# Altium footprint library ref-packages.PCBLIB: 1544 footprints (part 31 of 103)
Each footprint in its own frame and in the unit in brackets; x right, y up, seen from the top. Pads: shape width x height; smd on the part's side, far side on the other; paste and mask are expansions set on the pad; w line width, h text height; cw(c..) or ccw(c..) is an arc to the next point about the centre after c.
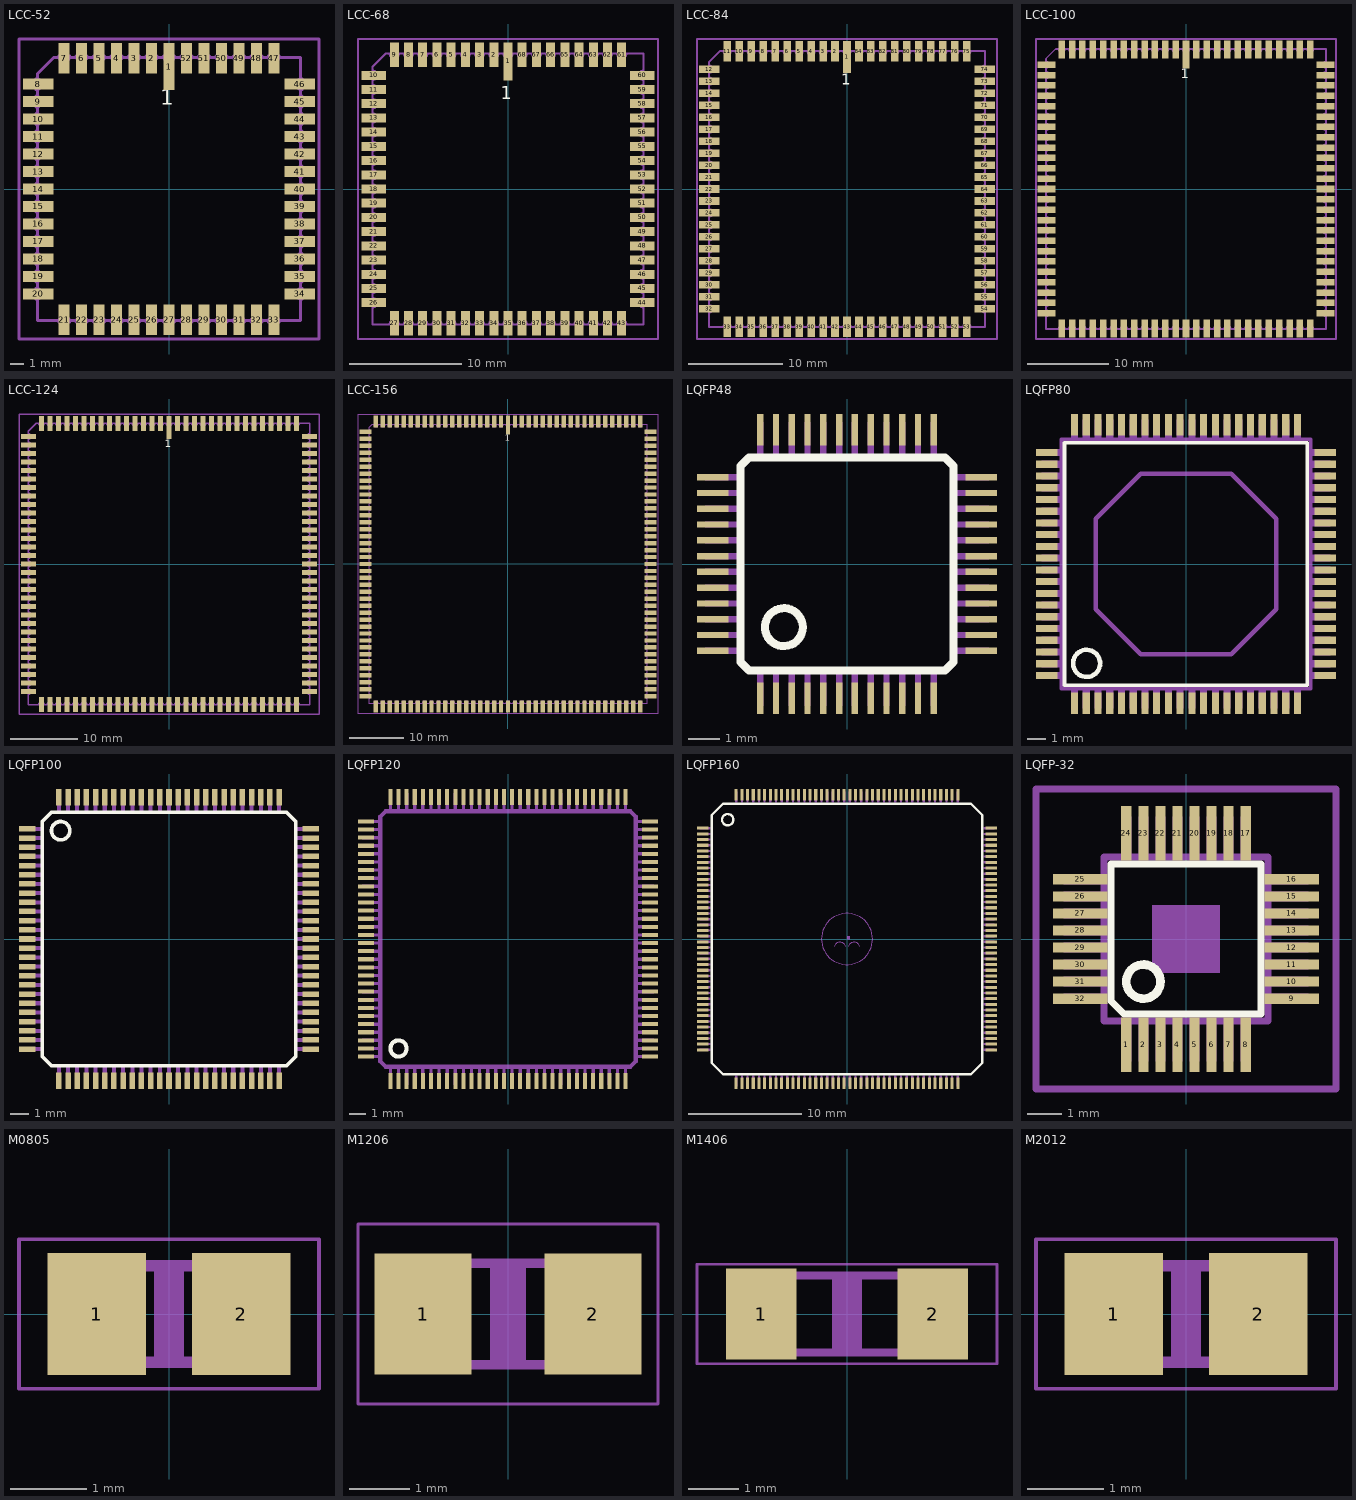
[diagram p30: the footprints below, top view; thin cyan lines are the x and y axes]

## LCC-52 [mil]
pads (52):
  rect 31.5x133.86 smd: 1(0,350.39)
  rect 31.5x86.61 smd: 2(-50,374.02) 3(-100,374.02) 4(-150,374.02) 5(-200,374.02) 6(-250,374.02) 7(-300,374.02) 21(-300,-374.02) 22(-250,-374.02) 23(-200,-374.02) 24(-150,-374.02) 25(-100,-374.02) 26(-50,-374.02) 27(0,-374.02) 28(50,-374.02) 29(100,-374.02) 30(150,-374.02) 31(200,-374.02) 32(250,-374.02) 33(300,-374.02) 47(300,374.02) 48(250,374.02) 49(200,374.02) 50(150,374.02) 51(100,374.02) 52(50,374.02)
  rect 86.61x31.5 smd: 8(-374.02,300) 9(-374.02,250) 10(-374.02,200) 11(-374.02,150) 12(-374.02,100) 13(-374.02,50) 14(-374.02,0) 15(-374.02,-50) 16(-374.02,-100) 17(-374.02,-150) 18(-374.02,-200) 19(-374.02,-250) 20(-374.02,-300) 34(374.02,-300) 35(374.02,-250) 36(374.02,-200) 37(374.02,-150) 38(374.02,-100) 39(374.02,-50) 40(374.02,0) 41(374.02,50) 42(374.02,100) 43(374.02,150) 44(374.02,200) 45(374.02,250) 46(374.02,300)
Top Overlay:
  text "1" at -25,225 h77.5
Mechanical 16:
  lines w8: -380.31,-315.75 ccw(c-380.31,-300) -380.31,-284.25 ; -380.31,-265.75 ccw(c-380.31,-250) -380.31,-234.25 ; -380.31,-215.75 ccw(c-380.31,-200) -380.31,-184.25 ; -380.31,-165.75 ccw(c-380.31,-150) -380.31,-134.25 ; -380.31,-115.75 ccw(c-380.31,-100) -380.31,-84.25 ; -380.31,-65.75 ccw(c-380.31,-50) -380.31,-34.25 ; -380.31,-15.75 ccw(c-380.31,0) -380.31,15.75 ; -380.31,34.25 ccw(c-380.31,50) -380.31,65.75 ; -380.31,84.25 ccw(c-380.31,100) -380.31,115.75 ; -380.31,134.25 ccw(c-380.31,150) -380.31,165.75 ; -380.31,184.25 ccw(c-380.31,200) -380.31,215.75 ; -380.31,234.25 ccw(c-380.31,250) -380.31,265.75 ; -380.31,284.25 ccw(c-380.31,300) -380.31,315.75 ; -376.38,-315.75 -376.38,-376.38 -315.75,-376.38 ; -376.38,-284.25 -376.38,-265.75 ; -376.38,-234.25 -376.38,-215.75 ; -376.38,-184.25 -376.38,-165.75 ; -376.38,-134.25 -376.38,-115.75 ; -376.38,-84.25 -376.38,-65.75 ; -376.38,-34.25 -376.38,-15.75 ; -376.38,15.75 -376.38,34.25 ; -376.38,65.75 -376.38,84.25 ; -376.38,115.75 -376.38,134.25 ; -376.38,165.75 -376.38,184.25 ; -376.38,215.75 -376.38,234.25 ; -376.38,265.75 -376.38,284.25 ; -376.38,315.75 -376.38,329.92 -329.92,376.38 -315.75,376.38 ; -315.75,-380.31 cw(c-300,-380.31) -284.25,-380.31 ; -315.75,380.31 ccw(c-300,380.31) -284.25,380.31 ; -284.25,-376.38 -265.75,-376.38 ; -284.25,376.38 -265.75,376.38 ; -265.75,-380.31 cw(c-250,-380.31) -234.25,-380.31 ; -265.75,380.31 ccw(c-250,380.31) -234.25,380.31 ; -234.25,-376.38 -215.75,-376.38 ; -234.25,376.38 -215.75,376.38 ; -215.75,-380.31 cw(c-200,-380.31) -184.25,-380.31 ; -215.75,380.31 ccw(c-200,380.31) -184.25,380.31 ; -184.25,-376.38 -165.75,-376.38 ; -184.25,376.38 -165.75,376.38 ; -165.75,-380.31 cw(c-150,-380.31) -134.25,-380.31 ; -165.75,380.31 ccw(c-150,380.31) -134.25,380.31 ; -134.25,-376.38 -115.75,-376.38 ; -134.25,376.38 -115.75,376.38 ; -115.75,-380.31 cw(c-100,-380.31) -84.25,-380.31 ; -115.75,380.31 ccw(c-100,380.31) -84.25,380.31 ; -84.25,-376.38 -65.75,-376.38 ; -84.25,376.38 -65.75,376.38 ; -65.75,-380.31 cw(c-50,-380.31) -34.25,-380.31 ; -65.75,380.31 ccw(c-50,380.31) -34.25,380.31 ; -34.25,-376.38 -15.75,-376.38 ; -34.25,376.38 -15.75,376.38 ; -15.75,-380.31 cw(c0,-380.31) 15.75,-380.31 ; -15.75,380.31 ccw(c0,380.31) 15.75,380.31 ; 15.75,-376.38 34.25,-376.38 ; 15.75,376.38 34.25,376.38 ; 34.25,-380.31 cw(c50,-380.31) 65.75,-380.31 ; 34.25,380.31 ccw(c50,380.31) 65.75,380.31 ; 65.75,-376.38 84.25,-376.38 ; 65.75,376.38 84.25,376.38 ; 84.25,-380.31 cw(c100,-380.31) 115.75,-380.31 ; 84.25,380.31 ccw(c100,380.31) 115.75,380.31 ; 115.75,-376.38 134.25,-376.38 ; 115.75,376.38 134.25,376.38 ; 134.25,-380.31 cw(c150,-380.31) 165.75,-380.31 ; 134.25,380.31 ccw(c150,380.31) 165.75,380.31 ; 165.75,-376.38 184.25,-376.38 ; 165.75,376.38 184.25,376.38 ; 184.25,-380.31 cw(c200,-380.31) 215.75,-380.31 ; 184.25,380.31 ccw(c200,380.31) 215.75,380.31 ; 215.75,-376.38 234.25,-376.38 ; 215.75,376.38 234.25,376.38 ; 234.25,-380.31 cw(c250,-380.31) 265.75,-380.31 ; 234.25,380.31 ccw(c250,380.31) 265.75,380.31 ; 265.75,-376.38 284.25,-376.38 ; 265.75,376.38 284.25,376.38 ; 284.25,-380.31 cw(c300,-380.31) 315.75,-380.31 ; 284.25,380.31 ccw(c300,380.31) 315.75,380.31 ; 315.75,-376.38 376.38,-376.38 376.38,-315.75 ; 315.75,376.38 376.38,376.38 376.38,315.75 ; 376.38,-284.25 376.38,-265.75 ; 376.38,-234.25 376.38,-215.75 ; 376.38,-184.25 376.38,-165.75 ; 376.38,-134.25 376.38,-115.75 ; 376.38,-84.25 376.38,-65.75 ; 376.38,-34.25 376.38,-15.75 ; 376.38,15.75 376.38,34.25 ; 376.38,65.75 376.38,84.25 ; 376.38,115.75 376.38,134.25 ; 376.38,165.75 376.38,184.25 ; 376.38,215.75 376.38,234.25 ; 376.38,265.75 376.38,284.25 ; 380.31,-315.75 cw(c380.31,-300) 380.31,-284.25 ; 380.31,-265.75 cw(c380.31,-250) 380.31,-234.25 ; 380.31,-215.75 cw(c380.31,-200) 380.31,-184.25 ; 380.31,-165.75 cw(c380.31,-150) 380.31,-134.25 ; 380.31,-115.75 cw(c380.31,-100) 380.31,-84.25 ; 380.31,-65.75 cw(c380.31,-50) 380.31,-34.25 ; 380.31,-15.75 cw(c380.31,0) 380.31,15.75 ; 380.31,34.25 cw(c380.31,50) 380.31,65.75 ; 380.31,84.25 cw(c380.31,100) 380.31,115.75 ; 380.31,134.25 cw(c380.31,150) 380.31,165.75 ; 380.31,184.25 cw(c380.31,200) 380.31,215.75 ; 380.31,234.25 cw(c380.31,250) 380.31,265.75 ; 380.31,284.25 cw(c380.31,300) 380.31,315.75
Mechanical 27:
  lines w7.87: -429.25,-429.25 429.25,-429.25 429.25,429.25 -429.25,429.25 -429.25,-429.25

## LCC-68 [mil]
pads (68):
  rect 31.5x133.86 smd: 1(0,448.82)
  rect 31.5x86.61 smd: 2(-50,472.44) 3(-100,472.44) 4(-150,472.44) 5(-200,472.44) 6(-250,472.44) 7(-300,472.44) 8(-350,472.44) 9(-400,472.44) 27(-400,-472.44) 28(-350,-472.44) 29(-300,-472.44) 30(-250,-472.44) 31(-200,-472.44) 32(-150,-472.44) 33(-100,-472.44) 34(-50,-472.44) 35(0,-472.44) 36(50,-472.44) 37(100,-472.44) 38(150,-472.44) 39(200,-472.44) 40(250,-472.44) 41(300,-472.44) 42(350,-472.44) 43(400,-472.44) 61(400,472.44) 62(350,472.44) 63(300,472.44) 64(250,472.44) 65(200,472.44) 66(150,472.44) 67(100,472.44) 68(50,472.44)
  rect 86.61x31.5 smd: 10(-472.44,400) 11(-472.44,350) 12(-472.44,300) 13(-472.44,250) 14(-472.44,200) 15(-472.44,150) 16(-472.44,100) 17(-472.44,50) 18(-472.44,0) 19(-472.44,-50) 20(-472.44,-100) 21(-472.44,-150) 22(-472.44,-200) 23(-472.44,-250) 24(-472.44,-300) 25(-472.44,-350) 26(-472.44,-400) 44(472.44,-400) 45(472.44,-350) 46(472.44,-300) 47(472.44,-250) 48(472.44,-200) 49(472.44,-150) 50(472.44,-100) 51(472.44,-50) 52(472.44,0) 53(472.44,50) 54(472.44,100) 55(472.44,150) 56(472.44,200) 57(472.44,250) 58(472.44,300) 59(472.44,350) 60(472.44,400)
Top Overlay:
  text "1" at -25,300 h77.5
Mechanical 16:
  lines w8: -476.38,-415.75 -476.38,-476.38 -415.75,-476.38 ; -476.38,-384.25 -476.38,-365.75 ; -476.38,-334.25 -476.38,-315.75 ; -476.38,-284.25 -476.38,-265.75 ; -476.38,-234.25 -476.38,-215.75 ; -476.38,-184.25 -476.38,-165.75 ; -476.38,-134.25 -476.38,-115.75 ; -476.38,-84.25 -476.38,-65.75 ; -476.38,-34.25 -476.38,-15.75 ; -476.38,15.75 -476.38,34.25 ; -476.38,65.75 -476.38,84.25 ; -476.38,115.75 -476.38,134.25 ; -476.38,165.75 -476.38,184.25 ; -476.38,215.75 -476.38,234.25 ; -476.38,265.75 -476.38,284.25 ; -476.38,315.75 -476.38,334.25 ; -476.38,365.75 -476.38,384.25 ; -476.38,415.75 -476.38,429.92 -429.92,476.38 -415.75,476.38 ; -476.31,-415.75 ccw(c-476.31,-400) -476.31,-384.25 ; -476.31,-365.75 ccw(c-476.31,-350) -476.31,-334.25 ; -476.31,-315.75 ccw(c-476.31,-300) -476.31,-284.25 ; -476.31,-265.75 ccw(c-476.31,-250) -476.31,-234.25 ; -476.31,-215.75 ccw(c-476.31,-200) -476.31,-184.25 ; -476.31,-165.75 ccw(c-476.31,-150) -476.31,-134.25 ; -476.31,-115.75 ccw(c-476.31,-100) -476.31,-84.25 ; -476.31,-65.75 ccw(c-476.31,-50) -476.31,-34.25 ; -476.31,-15.75 ccw(c-476.31,0) -476.31,15.75 ; -476.31,34.25 ccw(c-476.31,50) -476.31,65.75 ; -476.31,84.25 ccw(c-476.31,100) -476.31,115.75 ; -476.31,134.25 ccw(c-476.31,150) -476.31,165.75 ; -476.31,184.25 ccw(c-476.31,200) -476.31,215.75 ; -476.31,234.25 ccw(c-476.31,250) -476.31,265.75 ; -476.31,284.25 ccw(c-476.31,300) -476.31,315.75 ; -476.31,334.25 ccw(c-476.31,350) -476.31,365.75 ; -476.31,384.25 ccw(c-476.31,400) -476.31,415.75 ; -415.75,-476.31 cw(c-400,-476.31) -384.25,-476.31 ; -415.75,476.31 ccw(c-400,476.31) -384.25,476.31 ; -384.25,-476.38 -365.75,-476.38 ; -384.25,476.38 -365.75,476.38 ; -365.75,-476.31 cw(c-350,-476.31) -334.25,-476.31 ; -365.75,476.31 ccw(c-350,476.31) -334.25,476.31 ; -334.25,-476.38 -315.75,-476.38 ; -334.25,476.38 -315.75,476.38 ; -315.75,-476.31 cw(c-300,-476.31) -284.25,-476.31 ; -315.75,476.31 ccw(c-300,476.31) -284.25,476.31 ; -284.25,-476.38 -265.75,-476.38 ; -284.25,476.38 -265.75,476.38 ; -265.75,-476.31 cw(c-250,-476.31) -234.25,-476.31 ; -265.75,476.31 ccw(c-250,476.31) -234.25,476.31 ; -234.25,-476.38 -215.75,-476.38 ; -234.25,476.38 -215.75,476.38 ; -215.75,-476.31 cw(c-200,-476.31) -184.25,-476.31 ; -215.75,476.31 ccw(c-200,476.31) -184.25,476.31 ; -184.25,-476.38 -165.75,-476.38 ; -184.25,476.38 -165.75,476.38 ; -165.75,-476.31 cw(c-150,-476.31) -134.25,-476.31 ; -165.75,476.31 ccw(c-150,476.31) -134.25,476.31 ; -134.25,-476.38 -115.75,-476.38 ; -134.25,476.38 -115.75,476.38 ; -115.75,-476.31 cw(c-100,-476.31) -84.25,-476.31 ; -115.75,476.31 ccw(c-100,476.31) -84.25,476.31 ; -84.25,-476.38 -65.75,-476.38 ; -84.25,476.38 -65.75,476.38 ; -65.75,-476.31 cw(c-50,-476.31) -34.25,-476.31 ; -65.75,476.31 ccw(c-50,476.31) -34.25,476.31 ; -34.25,-476.38 -15.75,-476.38 ; -34.25,476.38 -15.75,476.38 ; -15.75,-476.31 cw(c0,-476.31) 15.75,-476.31 ; -15.75,476.31 ccw(c0,476.31) 15.75,476.31 ; 15.75,-476.38 34.25,-476.38 ; 15.75,476.38 34.25,476.38 ; 34.25,-476.31 cw(c50,-476.31) 65.75,-476.31 ; 34.25,476.31 ccw(c50,476.31) 65.75,476.31 ; 65.75,-476.38 84.25,-476.38 ; 65.75,476.38 84.25,476.38 ; 84.25,-476.31 cw(c100,-476.31) 115.75,-476.31 ; 84.25,476.31 ccw(c100,476.31) 115.75,476.31 ; 115.75,-476.38 134.25,-476.38 ; 115.75,476.38 134.25,476.38 ; 134.25,-476.31 cw(c150,-476.31) 165.75,-476.31 ; 134.25,476.31 ccw(c150,476.31) 165.75,476.31 ; 165.75,-476.38 184.25,-476.38 ; 165.75,476.38 184.25,476.38 ; 184.25,-476.31 cw(c200,-476.31) 215.75,-476.31 ; 184.25,476.31 ccw(c200,476.31) 215.75,476.31 ; 215.75,-476.38 234.25,-476.38 ; 215.75,476.38 234.25,476.38 ; 234.25,-476.31 cw(c250,-476.31) 265.75,-476.31 ; 234.25,476.31 ccw(c250,476.31) 265.75,476.31 ; 265.75,-476.38 284.25,-476.38 ; 265.75,476.38 284.25,476.38 ; 284.25,-476.31 cw(c300,-476.31) 315.75,-476.31 ; 284.25,476.31 ccw(c300,476.31) 315.75,476.31 ; 315.75,-476.38 334.25,-476.38 ; 315.75,476.38 334.25,476.38 ; 334.25,-476.31 cw(c350,-476.31) 365.75,-476.31 ; 334.25,476.31 ccw(c350,476.31) 365.75,476.31 ; 365.75,-476.38 384.25,-476.38 ; 365.75,476.38 384.25,476.38 ; 384.25,-476.31 cw(c400,-476.31) 415.75,-476.31 ; 384.25,476.31 ccw(c400,476.31) 415.75,476.31 ; 415.75,-476.38 476.38,-476.38 476.38,-415.75 ; 415.75,476.38 476.38,476.38 476.38,415.75 ; 476.31,-415.75 cw(c476.31,-400) 476.31,-384.25 ; 476.31,-365.75 cw(c476.31,-350) 476.31,-334.25 ; 476.31,-315.75 cw(c476.31,-300) 476.31,-284.25 ; 476.31,-265.75 cw(c476.31,-250) 476.31,-234.25 ; 476.31,-215.75 cw(c476.31,-200) 476.31,-184.25 ; 476.31,-165.75 cw(c476.31,-150) 476.31,-134.25 ; 476.31,-115.75 cw(c476.31,-100) 476.31,-84.25 ; 476.31,-65.75 cw(c476.31,-50) 476.31,-34.25 ; 476.31,-15.75 cw(c476.31,0) 476.31,15.75 ; 476.31,34.25 cw(c476.31,50) 476.31,65.75 ; 476.31,84.25 cw(c476.31,100) 476.31,115.75 ; 476.31,134.25 cw(c476.31,150) 476.31,165.75 ; 476.31,184.25 cw(c476.31,200) 476.31,215.75 ; 476.31,234.25 cw(c476.31,250) 476.31,265.75 ; 476.31,284.25 cw(c476.31,300) 476.31,315.75 ; 476.31,334.25 cw(c476.31,350) 476.31,365.75 ; 476.31,384.25 cw(c476.31,400) 476.31,415.75 ; 476.38,-384.25 476.38,-365.75 ; 476.38,-334.25 476.38,-315.75 ; 476.38,-284.25 476.38,-265.75 ; 476.38,-234.25 476.38,-215.75 ; 476.38,-184.25 476.38,-165.75 ; 476.38,-134.25 476.38,-115.75 ; 476.38,-84.25 476.38,-65.75 ; 476.38,-34.25 476.38,-15.75 ; 476.38,15.75 476.38,34.25 ; 476.38,65.75 476.38,84.25 ; 476.38,115.75 476.38,134.25 ; 476.38,165.75 476.38,184.25 ; 476.38,215.75 476.38,234.25 ; 476.38,265.75 476.38,284.25 ; 476.38,315.75 476.38,334.25 ; 476.38,365.75 476.38,384.25
Mechanical 27:
  lines w7.87: -527.68,-527.68 527.68,-527.68 527.68,527.68 -527.68,527.68 -527.68,-527.68

## LCC-84 [mil]
pads (84):
  rect 31.5x133.86 smd: 1(0,551.18)
  rect 31.5x86.61 smd: 2(-50,574.8) 3(-100,574.8) 4(-150,574.8) 5(-200,574.8) 6(-250,574.8) 7(-300,574.8) 8(-350,574.8) 9(-400,574.8) 10(-450,574.8) 11(-500,574.8) 33(-500,-574.8) 34(-450,-574.8) 35(-400,-574.8) 36(-350,-574.8) 37(-300,-574.8) 38(-250,-574.8) 39(-200,-574.8) 40(-150,-574.8) 41(-100,-574.8) 42(-50,-574.8) 43(0,-574.8) 44(50,-574.8) 45(100,-574.8) 46(150,-574.8) 47(200,-574.8) 48(250,-574.8) 49(300,-574.8) 50(350,-574.8) 51(400,-574.8) 52(450,-574.8) 53(500,-574.8) 75(500,574.8) 76(450,574.8) 77(400,574.8) 78(350,574.8) 79(300,574.8) 80(250,574.8) 81(200,574.8) 82(150,574.8) 83(100,574.8) 84(50,574.8)
  rect 86.61x31.5 smd: 12(-574.8,500) 13(-574.8,450) 14(-574.8,400) 15(-574.8,350) 16(-574.8,300) 17(-574.8,250) 18(-574.8,200) 19(-574.8,150) 20(-574.8,100) 21(-574.8,50) 22(-574.8,0) 23(-574.8,-50) 24(-574.8,-100) 25(-574.8,-150) 26(-574.8,-200) 27(-574.8,-250) 28(-574.8,-300) 29(-574.8,-350) 30(-574.8,-400) 31(-574.8,-450) 32(-574.8,-500) 54(574.8,-500) 55(574.8,-450) 56(574.8,-400) 57(574.8,-350) 58(574.8,-300) 59(574.8,-250) 60(574.8,-200) 61(574.8,-150) 62(574.8,-100) 63(574.8,-50) 64(574.8,0) 65(574.8,50) 66(574.8,100) 67(574.8,150) 68(574.8,200) 69(574.8,250) 70(574.8,300) 71(574.8,350) 72(574.8,400) 73(574.8,450) 74(574.8,500)
Top Overlay:
  text "1" at -25,418.11 h77.5
Mechanical 16:
  drawing of 173 lines, arcs and shapes, not listed
Mechanical 27:
  lines w7.87: -626.1,-626.1 626.1,-626.1 626.1,626.1 -626.1,626.1 -626.1,-626.1

## LCC-100 [mil]
pads (100):
  rect 31.5x133.86 smd: 1(0,649.61)
  rect 31.5x86.61 smd: 2(-50,673.23) 3(-100,673.23) 4(-150,673.23) 5(-200,673.23) 6(-250,673.23) 7(-300,673.23) 8(-350,673.23) 9(-400,673.23) 10(-450,673.23) 11(-500,673.23) 12(-550,673.23) 13(-600,673.23) 39(-600,-673.23) 40(-550,-673.23) 41(-500,-673.23) 42(-450,-673.23) 43(-400,-673.23) 44(-350,-673.23) 45(-300,-673.23) 46(-250,-673.23) 47(-200,-673.23) 48(-150,-673.23) 49(-100,-673.23) 50(-50,-673.23) 51(0,-673.23) 52(50,-673.23) 53(100,-673.23) 54(150,-673.23) 55(200,-673.23) 56(250,-673.23) 57(300,-673.23) 58(350,-673.23) 59(400,-673.23) 60(450,-673.23) 61(500,-673.23) 62(550,-673.23) 63(600,-673.23) 89(600,673.23) 90(550,673.23) 91(500,673.23) 92(450,673.23) 93(400,673.23) 94(350,673.23) 95(300,673.23) 96(250,673.23) 97(200,673.23) 98(150,673.23) 99(100,673.23) 100(50,673.23)
  rect 86.61x31.5 smd: 14(-673.23,600) 15(-673.23,550) 16(-673.23,500) 17(-673.23,450) 18(-673.23,400) 19(-673.23,350) 20(-673.23,300) 21(-673.23,250) 22(-673.23,200) 23(-673.23,150) 24(-673.23,100) 25(-673.23,50) 26(-673.23,0) 27(-673.23,-50) 28(-673.23,-100) 29(-673.23,-150) 30(-673.23,-200) 31(-673.23,-250) 32(-673.23,-300) 33(-673.23,-350) 34(-673.23,-400) 35(-673.23,-450) 36(-673.23,-500) 37(-673.23,-550) 38(-673.23,-600) 64(673.23,-600) 65(673.23,-550) 66(673.23,-500) 67(673.23,-450) 68(673.23,-400) 69(673.23,-350) 70(673.23,-300) 71(673.23,-250) 72(673.23,-200) 73(673.23,-150) 74(673.23,-100) 75(673.23,-50) 76(673.23,0) 77(673.23,50) 78(673.23,100) 79(673.23,150) 80(673.23,200) 81(673.23,250) 82(673.23,300) 83(673.23,350) 84(673.23,400) 85(673.23,450) 86(673.23,500) 87(673.23,550) 88(673.23,600)
Top Overlay:
  text "1" at -25,518.11 h77.5
Mechanical 16:
  drawing of 205 lines, arcs and shapes, not listed
Mechanical 27:
  lines w7.87: -724.53,-724.53 724.53,-724.53 724.53,724.53 -724.53,724.53 -724.53,-724.53

## LCC-124 [mil]
pads (124):
  rect 31.5x133.86 smd: 1(0,803.15)
  rect 31.5x86.61 smd: 2(-50,826.77) 3(-100,826.77) 4(-150,826.77) 5(-200,826.77) 6(-250,826.77) 7(-300,826.77) 8(-350,826.77) 9(-400,826.77) 10(-450,826.77) 11(-500,826.77) 12(-550,826.77) 13(-600,826.77) 14(-650,826.77) 15(-700,826.77) 16(-750,826.77) 48(-750,-826.77) 49(-700,-826.77) 50(-650,-826.77) 51(-600,-826.77) 52(-550,-826.77) 53(-500,-826.77) 54(-450,-826.77) 55(-400,-826.77) 56(-350,-826.77) 57(-300,-826.77) 58(-250,-826.77) 59(-200,-826.77) 60(-150,-826.77) 61(-100,-826.77) 62(-50,-826.77) 63(0,-826.77) 64(50,-826.77) 65(100,-826.77) 66(150,-826.77) 67(200,-826.77) 68(250,-826.77) 69(300,-826.77) 70(350,-826.77) 71(400,-826.77) 72(450,-826.77) 73(500,-826.77) 74(550,-826.77) 75(600,-826.77) 76(650,-826.77) 77(700,-826.77) 78(750,-826.77) 110(750,826.77) 111(700,826.77) 112(650,826.77) 113(600,826.77) 114(550,826.77) 115(500,826.77) 116(450,826.77) 117(400,826.77) 118(350,826.77) 119(300,826.77) 120(250,826.77) 121(200,826.77) 122(150,826.77) 123(100,826.77) 124(50,826.77)
  rect 86.61x31.5 smd: 17(-826.77,750) 18(-826.77,700) 19(-826.77,650) 20(-826.77,600) 21(-826.77,550) 22(-826.77,500) 23(-826.77,450) 24(-826.77,400) 25(-826.77,350) 26(-826.77,300) 27(-826.77,250) 28(-826.77,200) 29(-826.77,150) 30(-826.77,100) 31(-826.77,50) 32(-826.77,0) 33(-826.77,-50) 34(-826.77,-100) 35(-826.77,-150) 36(-826.77,-200) 37(-826.77,-250) 38(-826.77,-300) 39(-826.77,-350) 40(-826.77,-400) 41(-826.77,-450) 42(-826.77,-500) 43(-826.77,-550) 44(-826.77,-600) 45(-826.77,-650) 46(-826.77,-700) 47(-826.77,-750) 79(826.77,-750) 80(826.77,-700) 81(826.77,-650) 82(826.77,-600) 83(826.77,-550) 84(826.77,-500) 85(826.77,-450) 86(826.77,-400) 87(826.77,-350) 88(826.77,-300) 89(826.77,-250) 90(826.77,-200) 91(826.77,-150) 92(826.77,-100) 93(826.77,-50) 94(826.77,0) 95(826.77,50) 96(826.77,100) 97(826.77,150) 98(826.77,200) 99(826.77,250) 100(826.77,300) 101(826.77,350) 102(826.77,400) 103(826.77,450) 104(826.77,500) 105(826.77,550) 106(826.77,600) 107(826.77,650) 108(826.77,700) 109(826.77,750)
Top Overlay:
  text "1" at -25,668.11 h77.5
Mechanical 16:
  drawing of 253 lines, arcs and shapes, not listed
Mechanical 27:
  lines w7.87: -882.01,-882.01 882.01,-882.01 882.01,882.01 -882.01,882.01 -882.01,-882.01

## LCC-156 [mil]
pads (156):
  rect 31.5x133.86 smd: 1(0,1000)
  rect 31.5x86.61 smd: 2(-50,1023.62) 3(-100,1023.62) 4(-150,1023.62) 5(-200,1023.62) 6(-250,1023.62) 7(-300,1023.62) 8(-350,1023.62) 9(-400,1023.62) 10(-450,1023.62) 11(-500,1023.62) 12(-550,1023.62) 13(-600,1023.62) 14(-650,1023.62) 15(-700,1023.62) 16(-750,1023.62) 17(-800,1023.62) 18(-850,1023.62) 19(-900,1023.62) 20(-950,1023.62) 60(-950,-1023.62) 61(-900,-1023.62) 62(-850,-1023.62) 63(-800,-1023.62) 64(-750,-1023.62) 65(-700,-1023.62) 66(-650,-1023.62) 67(-600,-1023.62) 68(-550,-1023.62) 69(-500,-1023.62) 70(-450,-1023.62) 71(-400,-1023.62) 72(-350,-1023.62) 73(-300,-1023.62) 74(-250,-1023.62) 75(-200,-1023.62) 76(-150,-1023.62) 77(-100,-1023.62) 78(-50,-1023.62) 79(0,-1023.62) 80(50,-1023.62) 81(100,-1023.62) 82(150,-1023.62) 83(200,-1023.62) 84(250,-1023.62) 85(300,-1023.62) 86(350,-1023.62) 87(400,-1023.62) 88(450,-1023.62) 89(500,-1023.62) 90(550,-1023.62) 91(600,-1023.62) 92(650,-1023.62) 93(700,-1023.62) 94(750,-1023.62) 95(800,-1023.62) 96(850,-1023.62) 97(900,-1023.62) 98(950,-1023.62) 138(950,1023.62) 139(900,1023.62) 140(850,1023.62) 141(800,1023.62) 142(750,1023.62) 143(700,1023.62) 144(650,1023.62) 145(600,1023.62) 146(550,1023.62) 147(500,1023.62) 148(450,1023.62) 149(400,1023.62) 150(350,1023.62) 151(300,1023.62) 152(250,1023.62) 153(200,1023.62) 154(150,1023.62) 155(100,1023.62) 156(50,1023.62)
  rect 86.61x31.5 smd: 21(-1023.62,950) 22(-1023.62,900) 23(-1023.62,850) 24(-1023.62,800) 25(-1023.62,750) 26(-1023.62,700) 27(-1023.62,650) 28(-1023.62,600) 29(-1023.62,550) 30(-1023.62,500) 31(-1023.62,450) 32(-1023.62,400) 33(-1023.62,350) 34(-1023.62,300) 35(-1023.62,250) 36(-1023.62,200) 37(-1023.62,150) 38(-1023.62,100) 39(-1023.62,50) 40(-1023.62,0) 41(-1023.62,-50) 42(-1023.62,-100) 43(-1023.62,-150) 44(-1023.62,-200) 45(-1023.62,-250) 46(-1023.62,-300) 47(-1023.62,-350) 48(-1023.62,-400) 49(-1023.62,-450) 50(-1023.62,-500) 51(-1023.62,-550) 52(-1023.62,-600) 53(-1023.62,-650) 54(-1023.62,-700) 55(-1023.62,-750) 56(-1023.62,-800) 57(-1023.62,-850) 58(-1023.62,-900) 59(-1023.62,-950) 99(1023.62,-950) 100(1023.62,-900) 101(1023.62,-850) 102(1023.62,-800) 103(1023.62,-750) 104(1023.62,-700) 105(1023.62,-650) 106(1023.62,-600) 107(1023.62,-550) 108(1023.62,-500) 109(1023.62,-450) 110(1023.62,-400) 111(1023.62,-350) 112(1023.62,-300) 113(1023.62,-250) 114(1023.62,-200) 115(1023.62,-150) 116(1023.62,-100) 117(1023.62,-50) 118(1023.62,0) 119(1023.62,50) 120(1023.62,100) 121(1023.62,150) 122(1023.62,200) 123(1023.62,250) 124(1023.62,300) 125(1023.62,350) 126(1023.62,400) 127(1023.62,450) 128(1023.62,500) 129(1023.62,550) 130(1023.62,600) 131(1023.62,650) 132(1023.62,700) 133(1023.62,750) 134(1023.62,800) 135(1023.62,850) 136(1023.62,900) 137(1023.62,950)